# Altium footprint library Wurth_Elektronik_Electromechanic_Wire_to_Board_Connectors_rev16a.PCBLIB: 662 footprints (part 34 of 42)
Each footprint in its own frame and in the unit in brackets; x right, y up, seen from the top. Pads: shape width x height; smd on the part's side, far side on the other; paste and mask are expansions set on the pad; w line width, h text height; cw(c..) or ccw(c..) is an arc to the next point about the centre after c.
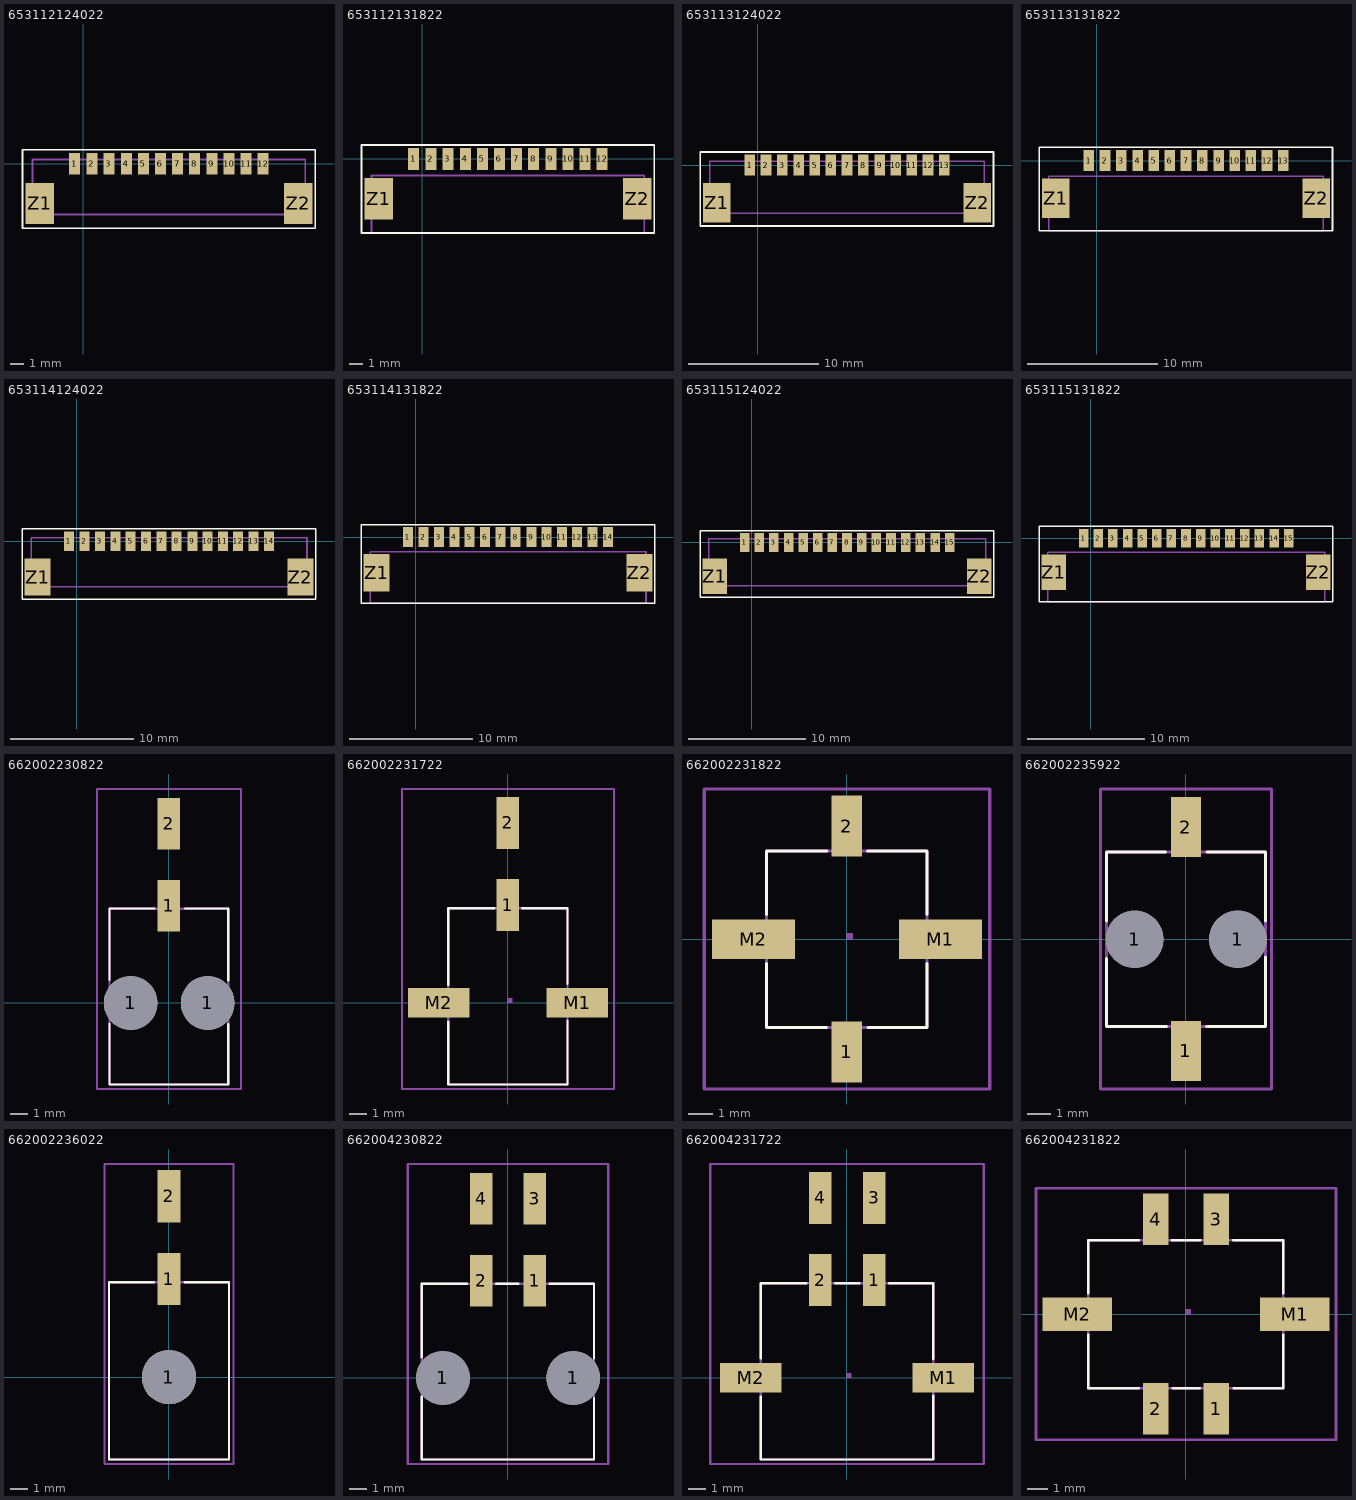
[diagram p33: the footprints below, top view; thin cyan lines are the x and y axes]

## 653112124022 [mil]
pads (14):
  rect 32x63 smd: 1(-24.61,0) 2(25,0) 3(74,0) 4(124,0) 5(173,0) 6(222,0) 7(271,0) 8(320,0) 9(370,0) 10(419,0) 11(468,0) 12(517,0)
  rect 83x119 smd: Z1(-125,-114.17) Z2(618,-114.17)
Top Overlay:
  lines w5: -174.21,-185.04 667,-185.04 667,40 -174.21,40 -174.21,-185.04
Mechanical 2:
  text ">NAME" at 100,50 h77.5
Mechanical 4:
  text ">VALUE" at 100,-250 h77.5
Mechanical 16:
  lines w5: -145.67,-145.67 638,-145.67 638,12 -145.67,12 -145.67,-145.67
  text "1" at -50,-50 h77.5

## 653112131822 [mil]
pads (14):
  rect 32x63 smd: 1(-24.61,0) 2(25,0) 3(74,0) 4(124,0) 5(173,0) 6(222,0) 7(271,0) 8(320,0) 9(370,0) 10(419,0) 11(468,0) 12(517,0)
  rect 83x119 smd: Z1(-125,-114.17) Z2(618,-114.17)
Top Overlay:
  lines w5: -174.21,-212.6 667,-212.6 667,40 -174.21,40 -174.21,-212.6
Mechanical 2:
  text ">NAME" at 100,50 h77.5
Mechanical 4:
  text ">VALUE" at 100,-275 h77.5
Mechanical 16:
  lines w5: -145.67,-212.6 638,-212.6 638,-47.24 -145.67,-47.24 -145.67,-212.6
  text "1" at -50,-25 h77.5

## 653113124022 [mil]
pads (15):
  rect 32x63 smd: 1(-24.61,0) 2(25,0) 3(74,0) 4(124,0) 5(173,0) 6(222,0) 7(271,0) 8(320,0) 9(370,0) 10(419,0) 11(468,0) 12(517,0) 13(566,0)
  rect 83x119 smd: Z1(-125,-114.17) Z2(667,-114.17)
Top Overlay:
  lines w5: -174.21,-185.04 716,-185.04 716,40 -174.21,40 -174.21,-185.04
Mechanical 2:
  text ">NAME" at 150,50 h77.5
Mechanical 4:
  text ">VALUE" at 125,-250 h77.5
Mechanical 16:
  lines w5: -145.67,-145.67 688,-145.67 688,12 -145.67,12 -145.67,-145.67
  text "1" at -50,-50 h77.5

## 653113131822 [mil]
pads (15):
  rect 32x63 smd: 1(-24.61,0) 2(25,0) 3(74,0) 4(124,0) 5(173,0) 6(222,0) 7(271,0) 8(320,0) 9(370,0) 10(419,0) 11(468,0) 12(517,0) 13(566,0)
  rect 83x119 smd: Z1(-125,-114.17) Z2(667,-114.17)
Top Overlay:
  lines w5: -174.21,-212.6 716,-212.6 716,40 -174.21,40 -174.21,-212.6
Mechanical 2:
  text ">NAME" at 150,50 h77.5
Mechanical 4:
  text ">VALUE" at 100,-275 h77.5
Mechanical 16:
  lines w5: -145.67,-212.6 688,-212.6 688,-47.24 -145.67,-47.24 -145.67,-212.6
  text "1" at -50,-25 h77.5

## 653114124022 [mil]
pads (16):
  rect 32x63 smd: 1(-24.61,0) 2(25,0) 3(74,0) 4(124,0) 5(173,0) 6(222,0) 7(271,0) 8(320,0) 9(370,0) 10(419,0) 11(468,0) 12(517,0) 13(566,0) 14(616,0)
  rect 83x119 smd: Z1(-125,-114.17) Z2(716,-114.17)
Top Overlay:
  lines w5: -174.21,-185.04 765,-185.04 765,40 -174.21,40 -174.21,-185.04
Mechanical 2:
  text ">NAME" at 200,75 h77.5
Mechanical 4:
  text ">VALUE" at 150,-250 h77.5
Mechanical 16:
  lines w5: -145.67,-145.67 737,-145.67 737,12 -145.67,12 -145.67,-145.67
  text "1" at -50,-50 h77.5

## 653114131822 [mil]
pads (16):
  rect 32x63 smd: 1(-24.61,0) 2(25,0) 3(74,0) 4(124,0) 5(173,0) 6(222,0) 7(271,0) 8(320,0) 9(370,0) 10(419,0) 11(468,0) 12(517,0) 13(566,0) 14(616,0)
  rect 83x119 smd: Z1(-125,-114.17) Z2(716,-114.17)
Top Overlay:
  lines w5: -174.21,-212.6 765,-212.6 765,40 -174.21,40 -174.21,-212.6
Mechanical 2:
  text ">NAME" at 200,75 h77.5
Mechanical 4:
  text ">VALUE" at 150,-275 h77.5
Mechanical 16:
  lines w5: -145.67,-212.6 737,-212.6 737,-47.24 -145.67,-47.24 -145.67,-212.6
  text "1" at -50,-25 h77.5

## 653115124022 [mil]
pads (17):
  rect 32x63 smd: 1(-24.61,0) 2(25,0) 3(74,0) 4(124,0) 5(173,0) 6(222,0) 7(271,0) 8(320,0) 9(370,0) 10(419,0) 11(468,0) 12(517,0) 13(566,0) 14(616,0) 15(665,0)
  rect 83x119 smd: Z1(-125,-114.17) Z2(765,-114.17)
Top Overlay:
  lines w5: -174.21,-185.04 814,-185.04 814,40 -174.21,40 -174.21,-185.04
Mechanical 2:
  text ">NAME" at 200,75 h77.5
Mechanical 4:
  text ">VALUE" at 175,-250 h77.5
Mechanical 16:
  lines w5: -145.67,-145.67 786,-145.67 786,12 -145.67,12 -145.67,-145.67
  text "1" at -50,-50 h77.5

## 653115131822 [mil]
pads (17):
  rect 32x63 smd: 1(-24.61,0) 2(25,0) 3(74,0) 4(124,0) 5(173,0) 6(222,0) 7(271,0) 8(320,0) 9(370,0) 10(419,0) 11(468,0) 12(517,0) 13(566,0) 14(616,0) 15(665,0)
  rect 83x119 smd: Z1(-125,-114.17) Z2(765,-114.17)
Top Overlay:
  lines w5: -174.21,-212.6 814,-212.6 814,40 -174.21,40 -174.21,-212.6
Mechanical 2:
  text ">NAME" at 200,75 h77.5
Mechanical 4:
  text ">VALUE" at 175,-275 h77.5
Mechanical 16:
  lines w5: -145.67,-212.6 786,-212.6 786,-47.24 -145.67,-47.24 -145.67,-212.6
  text "1" at -50,-25 h77.5

## 662002230822 [mil]
pads (4):
  round 119 hole 119: 1(-85.04,0) 1(86,0)
  rect 50x115 smd: 1(0,216) 2(0,398)
Top Overlay:
  lines w5: -131.89,-45.28 -131.89,-181.1 132,-181.1 132,-46.85 ; -131.89,51 -131.89,210 -32.68,210 ; 36,210 132,210 132,50
Mechanical 2:
  text ">NAME" at 225,82 h77.5
Mechanical 4:
  text ">VALUE" at 225,7 h77.5
Mechanical 16:
  lines w5: -131.89,-181.1 132,-181.1 132,209 -131.89,209 -131.89,-181.1
  text "1" at -25,157 h77.5
  text "2" at -25,382 h77.5
Mechanical 27:
  lines w5: -159.45,-190.94 160,-190.94 160,475 -159.45,475 -159.45,-190.94

## 662002231722 [mil]
pads (4):
  rect 50x115 smd: 1(0,216) 2(0,398)
  rect 136x65 smd: M1(154,0) M2(-153.35,0)
Top Overlay:
  lines w5: -131.89,-41.34 -131.89,-181.1 132,-181.1 132,-39.76 ; -131.89,40 -131.89,209 -30.32,209 ; 32,209 132,209 132,42
Mechanical 2:
  text ">NAME" at 296,71 h77.5
Mechanical 4:
  text ">VALUE" at 300,-18.31 h77.5
Mechanical 10:
  region: 0,0 10,0 10,10 0,10
Mechanical 16:
  lines w5: -131.89,-181.1 132,-181.1 132,209 -131.89,209 -131.89,-181.1
  text "1" at -25,157 h77.5
  text "2" at -25,332 h77.5
Mechanical 27:
  lines w5: -234.25,-190.94 235,-190.94 235,473 -234.25,473 -234.25,-190.94

## 662002231822 [mil]
pads (4):
  rect 50x100 smd: 1(0,-185.04) 2(0,186)
  rect 136x65 smd: M1(154,0) M2(-153.35,0)
Top Overlay:
  lines w5: -131.89,-39.76 -131.89,-144.88 -33.46,-144.88 ; -131.89,41 -131.89,145 -32.68,145 ; 34,145 132,145 132,41 ; 35,-144.88 132,-144.88 132,-39.76
Mechanical 2:
  text ">NAME" at 271,38 h77.5
Mechanical 4:
  text ">VALUE" at 269,-24.41 h77.5
Mechanical 10:
  region: 0,0 10,0 10,10 0,10
Mechanical 16:
  lines w5: -131.89,-144.88 132,-144.88 132,145 -131.89,145 -131.89,-144.88
  text "1" at -13.39,-216.14 h77.5
  text "2" at -15.35,167 h77.5
Mechanical 27:
  lines w5: -234.25,-246.06 -234.25,247 235,247 235,-246.06 -234.25,-246.06

## 662002235922 [mil]
pads (4):
  round 95 hole 95: 1(-85.04,0) 1(86,0)
  rect 50x100 smd: 1(0,-185.04) 2(0,186)
Top Overlay:
  lines w5: -131.89,-144.88 -131.89,-31.5 ; -131.89,30 -131.89,145 -34.25,145 ; -131.5,-144.49 -131.5,-144.88 -32.28,-144.88 ; 34,-144.88 132,-144.88 132,-143.7 132,-29.13 ; 35,145 132,145 132,30
Mechanical 2:
  text ">NAME" at 200,50 h77.5
Mechanical 4:
  text ">VALUE" at 200,-25 h77.5
Mechanical 16:
  lines w5: -131.89,-144.88 132,-144.88 132,145 -131.89,145 -131.89,-144.88
  text "1" at 25,-200 h77.5
Mechanical 27:
  lines w5: -141.73,-248.03 142,-248.03 142,249 -141.73,249 -141.73,-248.03

## 662002236022 [mil]
pads (3):
  round 119 hole 119: 1(0,0)
  rect 50x115 smd: 1(0,216) 2(0,398)
Top Overlay:
  lines w5: -33.07,209 -131.89,209 -131.89,-181.1 132,-181.1 132,209 34,209
Mechanical 2:
  text ">NAME" at 225,82 h77.5
Mechanical 4:
  text ">VALUE" at 225,7 h77.5
Mechanical 16:
  lines w5: -131.89,-181.1 132,-181.1 132,209 -131.89,209 -131.89,-181.1
  text "1" at -25,157 h77.5
  text "2" at -25,382 h77.5
Mechanical 27:
  lines w5: -141.73,-190.94 142,-190.94 142,469 -141.73,469 -141.73,-190.94

## 662004230822 [mil]
pads (6):
  round 119 hole 119: 1(-144.09,0) 1(145,0)
  rect 50x115 smd: 1(60,216) 2(-59.06,216) 3(60,398) 4(-59.06,398)
Top Overlay:
  lines w5: -190.94,-40.94 -190.94,-181.1 191,-181.1 191,-44.49 ; -190.94,46 -190.94,209 -90.55,209 ; -25.98,209 23,209 ; 93,209 191,209 191,44
Mechanical 2:
  text ">NAME" at 285,82 h77.5
Mechanical 4:
  text ">VALUE" at 285,7 h77.5
Mechanical 16:
  lines w5: -190.94,-181.1 191,-181.1 191,209 -190.94,209 -190.94,-181.1
  text "1" at 35,157 h77.5
  text "4" at -65.94,382 h77.5
Mechanical 27:
  lines w5: -222.44,-190.94 223,-190.94 223,475 -222.44,475 -222.44,-190.94

## 662004231722 [mil]
pads (6):
  rect 50x115 smd: 1(60,216) 2(-59.06,216) 3(60,398) 4(-59.06,398)
  rect 136x65 smd: M1(213,0) M2(-212.4,0)
Top Overlay:
  lines w5: -190.94,-41.73 -190.94,-181.1 191,-181.1 191,-39.37 ; -190.94,43 -190.94,209 -90.16,209 ; -25.98,209 27,209 ; 93,209 191,209 191,42
Mechanical 2:
  text ">NAME" at 355,71 h77.5
Mechanical 4:
  text ">VALUE" at 360,-18.31 h77.5
Mechanical 10:
  region: 0,0 10,0 10,10 0,10
Mechanical 16:
  lines w5: -190.94,-181.1 191,-181.1 191,209 -190.94,209 -190.94,-181.1
  text "1" at 35,157 h77.5
  text "4" at -65.94,332 h77.5
Mechanical 27:
  lines w5: -302.76,-190.94 303,-190.94 303,473 -302.76,473 -302.76,-190.94

## 662004231822 [mil]
pads (6):
  rect 50x100 smd: 1(60,-185.04) 2(-59.06,-185.04) 3(60,186) 4(-59.06,186)
  rect 136x65 smd: M1(213,0) M2(-212.4,0)
Top Overlay:
  lines w5: -190.94,-39.76 -190.94,-144.88 -92.52,-144.88 ; -190.94,41 -190.94,145 -91.73,145 ; -27.17,145 28,145 ; -25.98,-144.88 27,-144.88 ; 93,145 191,145 191,41 ; 94,-144.88 191,-144.88 191,-39.76
Mechanical 2:
  text ">NAME" at 330,38 h77.5
Mechanical 4:
  text ">VALUE" at 328,-24.41 h77.5
Mechanical 10:
  region: 0,0 10,0 10,10 0,10
  region: 0,0 10,0 10,10 0,10
  region: 0,0 10,0 10,10 0,10
Mechanical 16:
  lines w5: -190.94,-144.88 191,-144.88 191,145 -190.94,145 -190.94,-144.88
  text "1" at 46,-216.14 h77.5
  text "4" at -81.3,167 h77.5
Mechanical 27:
  lines w5: -293.31,-246.06 -293.31,247 294,247 294,-246.06 -293.31,-246.06